# Altium footprint library myintlib.PcbLib: 38 footprints (part 2 of 3)
Each footprint in its own frame and in the unit in brackets; x right, y up, seen from the top. Pads: shape width x height; smd on the part's side, far side on the other; paste and mask are expansions set on the pad; w line width, h text height; cw(c..) or ccw(c..) is an arc to the next point about the centre after c.
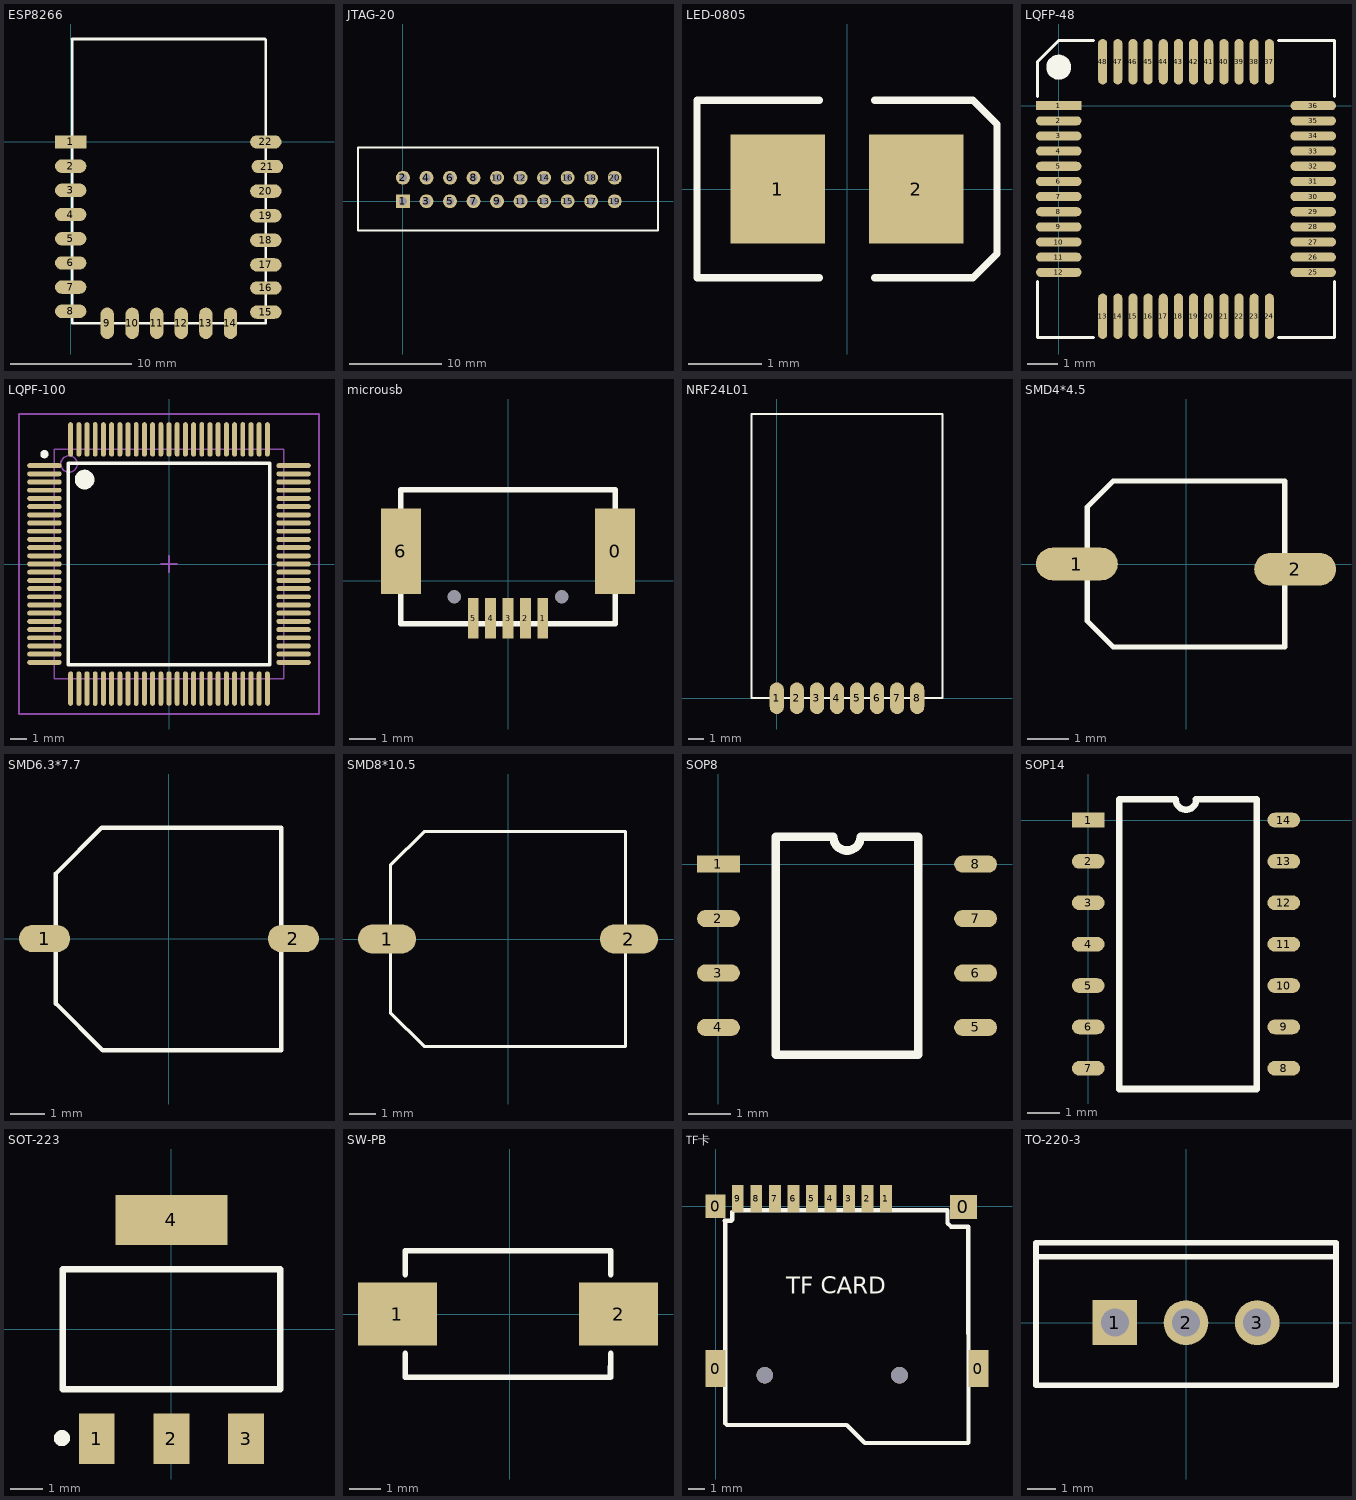
[diagram p1: the footprints below, top view; thin cyan lines are the x and y axes]

## ESP8266 [mm]
pads (22):
  rect 2.6x1.1 smd: 1(0,0)
  oval 2.6x1.1 smd: 2(0,-2) 3(0,-4) 4(0,-6) 5(0,-8) 6(0,-10) 7(0,-12) 8(0,-14) 15(16.127,-14.065) 16(16.127,-12.065) 17(16.129,-10.16) 18(16.129,-8.128) 19(16.129,-6.096) 20(16.129,-4.064) 21(16.256,-2.032) 22(16.129,0)
  oval 1.1x2.6 smd: 9(3.018,-14.984) 10(5.08,-14.986) 11(7.112,-14.986) 12(9.144,-14.986) 13(11.176,-14.986) 14(13.208,-14.986)
Top Overlay:
  lines w0.2: 0.127,8.509 0.127,-15 16.129,-15 16.129,8.444
  lines w0.254: 0.127,8.509 16.064,8.509
3D body: height 2.65, standoff -0.04, extent 0.123,-15.561 16.133,8.444

## JTAG-20 [mm] "JTAG下载口"
pads (20):
  rect 1.5x1.5 hole 0.9: 1(0,0)
  round 1.5 hole 0.9: 2(0,2.54) 3(2.54,0) 4(2.54,2.54) 5(5.08,0) 6(5.08,2.54) 7(7.62,0) 8(7.62,2.54) 9(10.16,0) 10(10.16,2.54) 11(12.7,0) 12(12.7,2.54) 13(15.24,0) 14(15.24,2.54) 15(17.78,0) 16(17.78,2.54) 17(20.32,0) 18(20.32,2.54) 19(22.86,0) 20(22.86,2.54)
Top Overlay:
  lines w0.2: -4.851,-3.15 -4.851,5.791 27.534,5.791 27.534,-3.15 -4.851,-3.15
3D body: height 9.71, standoff -2.79, extent -4.775,-3.323 27.685,5.817

## LED-0805 [mm]
pads (2):
  rect 1.3x1.5 smd: 1(-0.95,0) 2(0.95,0)
Top Overlay:
  lines w0.1: -0.381,-1.219 -2.057,-1.219 -2.057,1.219 -0.381,1.219 ; 0.381,-1.219 1.727,-1.219 2.057,-0.889 2.057,0.889 1.727,1.219 0.381,1.219
3D body: height 0.81, standoff -0.01, extent -1,-0.625 1,0.625

## LQFP-48 [mm]
pads (48):
  rect 1.5x0.3 smd: 1(0,0)
  oval 1.5x0.3 smd: 2(0,-0.5) 3(0,-1) 4(0,-1.5) 5(0,-2) 6(0,-2.5) 7(0,-3) 8(0,-3.5) 9(0,-4) 10(0,-4.5) 11(0,-5) 12(0,-5.5) 25(8.4,-5.5) 26(8.4,-5) 27(8.4,-4.5) 28(8.4,-4) 29(8.4,-3.5) 30(8.4,-3) 31(8.4,-2.5) 32(8.4,-2) 33(8.4,-1.5) 34(8.4,-1) 35(8.4,-0.5) 36(8.4,0)
  oval 0.3x1.5 smd: 13(1.45,-6.95) 14(1.95,-6.95) 15(2.45,-6.95) 16(2.95,-6.95) 17(3.45,-6.95) 18(3.95,-6.95) 19(4.45,-6.95) 20(4.95,-6.95) 21(5.45,-6.95) 22(5.95,-6.95) 23(6.45,-6.95) 24(6.95,-6.95) 37(6.95,1.45) 38(6.45,1.45) 39(5.95,1.45) 40(5.45,1.45) 41(4.95,1.45) 42(4.45,1.45) 43(3.95,1.45) 44(3.45,1.45) 45(2.95,1.45) 46(2.45,1.45) 47(1.95,1.45) 48(1.45,1.45)
Top Overlay:
  circle w0.254: c0,1.27 r0.284
  rectangle: -0.254,1.016 0.254,1.524
  lines w0.1: -0.7,-5.8 -0.7,-7.65 1.15,-7.65 ; -0.7,0.3 -0.7,1.45 0,2.15 1.15,2.15 ; 7.25,-7.65 9.1,-7.65 9.1,-5.8 ; 7.25,2.15 9.1,2.15 9.1,0.3
3D body: height 1.5, standoff 0, extent -0.309,-7.294 8.691,1.706

## LQPF-100 [mm]
pads (100):
  oval 2.1x0.3 smd: 1(-7.6,6) 2(-7.6,5.5) 3(-7.6,5) 4(-7.6,4.5) 5(-7.6,4) 6(-7.6,3.5) 7(-7.6,3) 8(-7.6,2.5) 9(-7.6,2) 10(-7.6,1.5) 11(-7.6,1) 12(-7.6,0.5) 13(-7.6,0) 14(-7.6,-0.5) 15(-7.6,-1) 16(-7.6,-1.5) 17(-7.6,-2) 18(-7.6,-2.5) 19(-7.6,-3) 20(-7.6,-3.5) 21(-7.6,-4) 22(-7.6,-4.5) 23(-7.6,-5) 24(-7.6,-5.5) 25(-7.6,-6) 51(7.6,-6) 52(7.6,-5.5) 53(7.6,-5) 54(7.6,-4.5) 55(7.6,-4) 56(7.6,-3.5) 57(7.6,-3) 58(7.6,-2.5) 59(7.6,-2) 60(7.6,-1.5) 61(7.6,-1) 62(7.6,-0.5) 63(7.6,0) 64(7.6,0.5) 65(7.6,1) 66(7.6,1.5) 67(7.6,2) 68(7.6,2.5) 69(7.6,3) 70(7.6,3.5) 71(7.6,4) 72(7.6,4.5) 73(7.6,5) 74(7.6,5.5) 75(7.6,6)
  oval 0.3x2.1 smd: 26(-6,-7.6) 27(-5.5,-7.6) 28(-5,-7.6) 29(-4.5,-7.6) 30(-4,-7.6) 31(-3.5,-7.6) 32(-3,-7.6) 33(-2.5,-7.6) 34(-2,-7.6) 35(-1.5,-7.6) 36(-1,-7.6) 37(-0.5,-7.6) 38(0,-7.6) 39(0.5,-7.6) 40(1,-7.6) 41(1.5,-7.6) 42(2,-7.6) 43(2.5,-7.6) 44(3,-7.6) 45(3.5,-7.6) 46(4,-7.6) 47(4.5,-7.6) 48(5,-7.6) 49(5.5,-7.6) 50(6,-7.6) 76(6,7.6) 77(5.5,7.6) 78(5,7.6) 79(4.5,7.6) 80(4,7.6) 81(3.5,7.6) 82(3,7.6) 83(2.5,7.6) 84(2,7.6) 85(1.5,7.6) 86(1,7.6) 87(0.5,7.6) 88(0,7.6) 89(-0.5,7.6) 90(-1,7.6) 91(-1.5,7.6) 92(-2,7.6) 93(-2.5,7.6) 94(-3,7.6) 95(-3.5,7.6) 96(-4,7.6) 97(-4.5,7.6) 98(-5,7.6) 99(-5.5,7.6) 100(-6,7.6)
Top Overlay:
  circle w0.6: c-5.15,5.15 r0.3
  circle w0.25: c-7.6,6.7 r0.125
  lines w0.2: -6.15,-6.15 6.15,-6.15 6.15,6.15 -6.15,6.15 -6.15,-6.15
Mechanical 13:
  circle w0.1: c-6.1,6.1 r0.5
  lines w0.1: -7,-7 7,-7 7,7 -7,7 -7,-7
Mechanical 15:
  lines w0.1: -0.5,0 0.5,0 ; 0,-0.5 0,0.5 ; -9.15,-9.15 9.15,-9.15 9.15,9.15 -9.15,9.15 -9.15,-9.15
3D body: height 0.8, standoff 0, extent -7,-7 7,7

## microusb [mm]
pads (9):
  rect 1.5x3.2 smd: 0(4,1.1) 6(-4,1.1)
  rect 0.4x1.5 smd: 1(1.3,-1.4) 2(0.65,-1.4) 3(0,-1.4) 4(-0.65,-1.4) 5(-1.3,-1.4)
  round 0 hole 0.5: 8(2,-0.6) 9(-2,-0.6)
Top Overlay:
  lines w0.2: -4,-1.6 0,-1.6 4,-1.6 4,3.4 -4,3.4 -4,-1.6
3D body: height 2.73, standoff -0.3, extent -4.039,-1.709 4.04,3.855

## NRF24L01 [mm] "贴片式"
pads (8):
  oval 0.9x2 smd: 1(0,0) 2(1.27,0) 3(2.54,0) 4(3.81,0) 5(5.08,0) 6(6.35,0) 7(7.62,0) 8(8.89,0)
Top Overlay:
  lines w0.127: -1.6,0 10.49,0 10.49,18 -1.6,18 -1.6,0

## SMD4*4.5 [mm] "10UF/16V"
pads (2):
  oval 2x0.8 smd: 1(-2.667,0) 2(2.667,-0.127)
Top Overlay:
  lines w0.127: -2.413,-1.397 -1.778,-2.032 2.413,-2.032 2.413,2.032 -1.778,2.032 -2.413,1.397 -2.413,-1.397
3D body: height 5.4, standoff -0.05, extent -2.5,-2.15 2.5,2.15

## SMD6.3*7.7 [mm] "100UF/35V电解电容"
pads (2):
  oval 1.5x0.8 smd: 1(-3.632,0) 2(3.658,0)
Top Overlay:
  lines w0.127: -3.302,-1.905 -3.302,1.905 -1.956,3.251 3.302,3.251 3.302,-3.277 -1.93,-3.277 -3.302,-1.905
3D body: height 5.9, standoff -0.05, extent -3.65,-3.3 3.65,3.3

## SMD8*10.5 [mm] "220UF/35V"
pads (2):
  oval 2.2x1.1 smd: 1(-4.572,0) 2(4.572,0)
Top Overlay:
  lines w0.127: -4.445,-2.794 -4.445,2.794 -3.175,4.064 4.445,4.064 4.445,-4.064 -3.175,-4.064 -4.445,-2.794
3D body: height 11.9, standoff -0.05, extent -4.5,-4.15 4.5,4.15

## SOP8 [mm]
pads (8):
  rect 1x0.4 smd: 1(0,0)
  oval 1x0.4 smd: 2(0,-1.27) 3(0,-2.54) 4(0,-3.81) 5(6,-3.81) 6(6,-2.54) 7(6,-1.27) 8(6,0)
Top Overlay:
  lines w0.2: 1.335,-4.445 1.335,0.635 2.682,0.635 ccw(c3,0.635) 3.317,0.635 4.665,0.635 4.665,-4.445 1.335,-4.445
3D body: height 1.75, standoff 0, extent -0.079,-4.355 5.921,0.545

## SOP14 [mm]
pads (14):
  rect 1x0.45 smd: 1(0,0)
  oval 1x0.45 smd: 2(0,-1.27) 3(0,-2.54) 4(0,-3.81) 5(0,-5.08) 6(0,-6.35) 7(0,-7.62) 8(6,-7.62) 9(6,-6.35) 10(6,-5.08) 11(6,-3.81) 12(6,-2.54) 13(6,-1.27) 14(6,0)
Top Overlay:
  lines w0.2: 2.667,0.635 0.954,0.635 0.954,-8.255 5.173,-8.255 5.173,0.635 3.302,0.635 ; 2.682,0.635 ccw(c3,0.635) 3.317,0.635
3D body: height 1.75, standoff -0.01, extent -0.051,-8.185 6.148,0.565

## SOT-223 [mm]
pads (4):
  rect 1.1x1.55 smd: 1(-2.3,-3.375) 2(0,-3.375) 3(2.3,-3.375)
  rect 3.45x1.55 smd: 4(0,3.375)
Top Overlay:
  circle w0.25: c-3.376,-3.353 r0.125
  lines w0.2: -3.35,-1.85 3.35,-1.85 3.35,1.85 -3.35,1.85 -3.35,-1.85
3D body: height 0.3, standoff 0, extent 1.905,-3.937 2.794,-2.032
3D body: height 0.3, standoff 0, extent -0.508,-3.937 0.381,-2.032
3D body: height 0.3, standoff 0, extent -2.794,-3.937 -1.905,-2.032
3D body: height 0.3, standoff 0, extent -1.651,2.159 1.651,3.429
3D body: height 0.8, standoff 0, extent -3.302,-2.032 3.302,2.159

## SW-PB [mm] "贴片按键"
pads (2):
  rect 2.5x2 smd: 1(-3.556,0) 2(3.444,0)
Top Overlay:
  lines w0.178: -3.306,-1.25 -3.306,-2 3.19,-2 3.194,-1.25 ; -3.306,1.25 -3.306,2 3.194,2 3.194,1.25
3D body: height 0.8, standoff 0, extent -3.302,-2.032 3.175,2.032
3D body: height 1.2, standoff 0.8, extent -1.27,-0.762 1.143,0.762

## TF卡 [mm] "自弹TF卡卡座"
pads (13):
  rect 1.2x2.2 smd: 0(0,-9.652) 0(15.627,-9.652)
  rect 1.2x1.4 smd: 0(0,0)
  rect 1.6x1.4 smd: 0(14.727,-0.052)
  rect 0.7x1.6 smd: 1(10.127,0.448) 2(9.027,0.448) 3(7.927,0.448) 4(6.827,0.448) 5(5.727,0.448) 6(4.627,0.448) 7(3.527,0.448) 8(2.427,0.448) 9(1.327,0.448)
via 2.927,-10.052 diameter 1 hole 1
via 10.927,-10.052 diameter 1 hole 1
Top Layer:
  lines w0.254: 0.533,-0.864 0.584,-0.914 ; 0.584,-12.903 0.686,-13.005 ; 0.991,-0.356 1.092,-0.254
Top Overlay:
  lines w0.254: 0.533,-0.864 0.94,-0.864 0.991,-0.813 0.991,-0.356 ; 0.584,-12.903 0.584,-0.914 ; 0.686,-13.005 7.798,-13.005 8.865,-14.072 15.007,-14.072 ; 1.092,-0.254 13.792,-0.254 13.792,-1.016 13.995,-1.219 15.011,-1.219 15.027,-14.052
  text "TF CARD" at 4.191,-5.207 h1

## TO-220-3 [mm]
pads (3):
  rect 1.6x1.6 hole 1: 1(-2.54,0)
  round 1.6 hole 1: 2(0,0) 3(2.54,0)
Top Overlay:
  lines w0.2: -5.35,2.35 5.35,2.35 ; -5.35,-2.235 -5.35,2.85 5.35,2.85 5.35,-2.235 -5.35,-2.235
3D body: height 21.1, standoff -8.73, extent -7.225,-1.829 7.175,9.093